# Altium schematic symbol library LimeMicroAltiumLib.SchLib: 590 symbols (part 5 of 13) (continued)
## BAT54C_shottky_diode
designator D?, comment BAT54C
Part Description: Diode Array 1 Pair Common Cathode Schottky 30 V 200mA (DC) Surface Mount TO-236-3, SC-59, SOT-23-3; Manufacturer: Comchip; Manufacturer Part Number 1: BAT54C-G; Max Reverse Voltage (DC): 30V; Max Power Dissipation: 225mW; Average Rectified Current: 200mA; Recovery Time: 5ns; Element Configuration: Common Cathode; ComponentLink1URL: http://www.farnell.com/datasheets/1918741.pdf; ComponentLink1Description: http://www.farnell.com/datasheets/1918741.pdf; ComponentLink2URL: http://www.farnell.com/datasheets/2353871.pdf; ComponentLink2Description: http://www.farnell.com/datasheets/2353871.pdf; ComponentLink3URL: https://www.alliedelec.com/m/d/272158a697e3f24d20806a718aa29d59.pdf; ComponentLink3Description: https://www.alliedelec.com/m/d/272158a697e3f24d20806a718aa29d59.pdf; ComponentLink4URL: http://www.onsemi.com/pub/Collateral/BAT54SLT1-D.PDF; ComponentLink4Description: http://www.onsemi.com/pub/Collateral/BAT54SLT1-D.PDF; Supplier 1: Digi-Key; Supplier Part Number 1: 641-1320-1-ND; Stock 1: 764277; Pricing 1: 1=0,23000, 10=0,18500, 100=0,09830, 500=0,06468, 1000=0,04399 (USD); RoHS: Yes; Mount: Surface Mount; Case/Package: TO-236-3; Package Quantity: 1; Reverse Recovery Time: 5ns; Packaging: Tape and Reel; ComponentLink5URL: https://datasheet.ciiva.com/4717/bat54-9536-4717410.pdf?src-supplier=Mouser; ComponentLink5Description: https://datasheet.ciiva.com/4717/bat54-9536-4717410.pdf?src-supplier=Mouser; ComponentLink6URL: https://datasheet.ciiva.com/904/bat54-904630.pdf?src-supplier=Digi-Key; ComponentLink6Description: https://datasheet.ciiva.com/904/bat54-904630.pdf?src-supplier=Digi-Key; ComponentLink7URL: https://datasheet.ciiva.com/904/bat54-904631.pdf?src-supplier=Digi-Key; ComponentLink7Description: https://datasheet.ciiva.com/904/bat54-904631.pdf?src-supplier=Digi-Key; ComponentLink8URL: https://datasheet.ciiva.com/904/bat54-904632.pdf?src-supplier=Digi-Key; ComponentLink8Description: https://datasheet.ciiva.com/904/bat54-904632.pdf?src-supplier=Digi-Key
footprint BAT54C_SOT23-3 (SOT23, 3 pin)
pins: A1, A2, C

## BAT54SLT1G_shottky_diode
designator D?, comment BAT54SLT1G
Manufacturer: ON Semiconductor; Part Description: Diode Array 1 Pair Series Connection Schottky 30V 200mA (DC) Surface Mount TO-236-3, SC-59, SOT-23-3; Max Surge Current: 600mA; Forward Current: 200mA; Forward Voltage: 800mV; Peak Reverse Current: 2uA; Recovery Time: 5ns; Element Configuration: Dual; Max Repetitive Reverse Voltage (Vrrm): 30V; Peak Non-Repetitive Surge Current: 1A; Power Dissipation: 225mW; Capacitance: 10pF; Supplier 1: Digi-Key; Manufacturer Part Number 1: BAT54SLT1G; RoHS: Yes; Stock 1: 1449452; Pricing 1: 1 = 0,19000, 10 = 0,17200, 100 = 0,09350, 500 = 0,05756, 1000 = 0,03925 (USD); Case/Package: SOT-23-3; Number of Pins: 3; Contact Plating: Matte,Tin; Min Operating Temperature: -55°C; Max Operating Temperature: 150°C; Packaging: Tape and Reel; Package Quantity: 3000; Average Rectified Current: 200mA; Reverse Recovery Time: 5ns; Max Reverse Leakage Current: 2uA; Current Rating: 200mA; Voltage Rating (DC): 30V; Max Reverse Voltage (DC): 30V; Max Forward Surge Current (Ifsm): 600mA; Length: 2.9mm; Height: 0.94mm; Width: 1.3mm; Radiation Hardening: No; Lead Free: Lead Free; Halogen Free: Halogen Free; REACH SVHC: No SVHC; ComponentLink1URL: http://www.farnell.com/datasheets/1918741.pdf; ComponentLink1Description: http://www.farnell.com/datasheets/1918741.pdf; ComponentLink2URL: http://www.farnell.com/datasheets/2353871.pdf; ComponentLink2Description: http://www.farnell.com/datasheets/2353871.pdf; ComponentLink3URL: https://www.alliedelec.com/m/d/272158a697e3f24d20806a718aa29d59.pdf; ComponentLink3Description: https://www.alliedelec.com/m/d/272158a697e3f24d20806a718aa29d59.pdf; ComponentLink4URL: http://www.onsemi.com/pub/Collateral/BAT54SLT1-D.PDF; ComponentLink4Description: http://www.onsemi.com/pub/Collateral/BAT54SLT1-D.PDF; Supplier Part Number 1: BAT54SLT1GOSCT-ND
footprint BAT54SLT1G_SOT23-3 (SOT23, 3 pin)
pins: A, A/C, C

## BAV99WT1G_DUAL_DIODE
designator VD?, comment BAV99WT1G
Manufacturer: ON Semiconductor; Manufacturer Part Number 1: SBAV99WT1G; Part Description: Diode Array 1 Pair Series Connection Standard 100V 215mA (DC) Surface Mount SC-70, SOT-323; Max Surge Current: 500mA; Recovery Time: 6ns; Forward Current: 715mA; Peak Reverse Current: 2.5uA; Forward Voltage: 1.25V; Element Configuration: Dual; Max Repetitive Reverse Voltage (Vrrm): 70V; Peak Non-Repetitive Surge Current: 2A; Max Reverse Voltage (DC): 100V; Max Power Dissipation: 200mW; Supplier 1: Digi-Key; Stock 1: 1217; Pricing 1: 1=0.32, 10=0.259, 100=0.1375, 500=0.09044, 1000=0.0615 (USD); Case/Package: SOT-323-3; Number of Pins: 3; Min Operating Temperature: -65°C; Max Operating Temperature: 150°C; Package Quantity: 3000; Packaging: Tape and Reel; Average Rectified Current: 715mA; Reverse Recovery Time: 6ns; Max Reverse Leakage Current: 2.5uA; Max Forward Surge Current (Ifsm): 500mA; Length: 2.2mm; Height: 0.9mm; Width: 1.35mm; Radiation Hardening: No; REACH SVHC: No SVHC; Lead Free: Lead Free; Halogen Free: Halogen Free; Supplier Part Number 1: SBAV99WT1GOSCT-ND
footprint SC-70_BAV99WT1G (SC-70 (SOT323), 3 pin)
pins: 1, 2, 3

## BF1105R,215
designator VT?, comment RF MOSFET
Manufacturer Part Number 1: BF1105R,215; Manufacturer: NXP Semiconductors; Part Description: RF MOSFET Transistors Trans MOSFET N-CH 7V 0.03A 4pin(3+Tab); Voltage - Rated: 7V; Noise Figure: 1.7dB; Current Rating: 30mA; Gain: 20dB; Transistor Type: N-Channel Dual Gate; Frequency: 800MHz; Voltage - Test: 5V; Supplier 1: Digi-Key; RoHS: RoHS Compliant; Supplier Device Package: SOT-143R; Power - Output: -; Current - Test: -; Packaging: Digi-Reel®; Package / Case: SOT-143R; Category: Discrete Semiconductor Products; Supplier Part Number 1: 568-12530-6-ND
footprint BF1105R_SOT143R4 (RF MOSFET Transistors Trans MOSFET N-CH 7V 0.03A 4pin(3+Tab). SOT-143R-4 package)
pins: 1 S, 2 D, 3 G2, 4 G1

## BFCN-1860+
designator IC?
Manufacturer: Minicircuits; Part Description: 1580 to 2200 MHz 50R bandpass filter; Supplier 1: Minicircuits; Supplier Part Number 1: BFCN-1860+; Manufacturer Part Number 1: BFCN-1860+
footprint SAW_BFCN-1860+
pins: 1 Input (in), 2 GND, 3 Output (out), 4 GND

## BFCN-2435+
designator IC?
Manufacturer: Minicircuits; Part Description: 2340 to 2530 MHz 50R bandpass filter; Supplier 1: Minicircuits; Supplier Part Number 1: BFCN-2435+; Manufacturer Part Number 1: BFCN-2435+
footprint SAW_BFCN-1860+
pins: 1 Input (in), 2 GND, 3 Output (out), 4 GND

## BFCN-2700+
designator IC?
Manufacturer: Minicircuits; Part Description: 2600 to 2800 MHz 50R bandpass filter; Supplier 1: Minicircuits; Supplier Part Number 1: BFCN-2700+; Manufacturer Part Number 1: BFCN-2700+
footprint SAW_BFCN-1860+
pins: 1 Input (in), 2 GND, 3 Output (out), 4 GND

## BFCN-2850+
designator IC?
Manufacturer: Minicircuits; Part Description: 2750 to 2950 MHz 50R bandpass filter; Supplier 1: Minicircuits; Supplier Part Number 1: BFCN-2850+; Manufacturer Part Number 1: BFCN-2850+
footprint SAW_BFCN-1860+
pins: 1 Input (in), 2 GND, 3 Output (out), 4 GND

## BFCV-3350+
designator IC?
LTCC Bandpass Filter: 50Ω, 2570 to 4130 MHz; Manufacturer: Mini-Circuits; Part Description: LTCC Bandpass Filter: 50Ω, 2570 to 4130 MHz; Manufacturer Part Number 1: BFCV-3350+; Supplier 1: Mini-Circuits; Supplier Part Number 1: BFCV-3350+
footprint BFCV-3350+
pins: 1 IN (in), 2 GND, 3 OUT (out), 4 GND

## BFT92,215_PNP
designator VT, comment BFT92,215
Manufacturer: NXP Semiconductors; Part Description: RF TRANS PNP 15V 5GHZ TO236AB; Manufacturer Part Number: BFT92215; Polarity: PNP; Max Power Dissipation: 300mW; hFE Min: 50; Number of Elements: 1; Emitter Base Voltage (VEBO): 2V; Max Collector Current: 25mA; Frequency: 5GHz; Collector Emitter Voltage (VCEO): 15V; Collector Base Voltage (VCBO): 20V; Gain: 18dB; Element Configuration: Single; Continuous Collector Current: -25mA; Supplier 1: Digi-Key; Stock 1: 0; RoHS: Yes; Mount: Surface Mount; Case/Package: TO-236AB; Number of Pins: 3; Weight: 0.00709oz; Contact Plating: Tin; Min Operating Temperature: -65°C; Max Operating Temperature: 175°C; Packaging: Tape and Reel; Package Quantity: 1; Output Power: 300mW; Transition Frequency: 5GHz; Collector Emitter Breakdown Voltage: 15V; Max Breakdown Voltage: 15V; Power Dissipation: 300mW; Max Frequency: 5GHz; Gain Bandwidth Product: 5GHz; Series: -; Length: 3mm; Width: 1.4mm; Height: 1mm; Radiation Hardening: No; Lead Free: Lead Free; REACH SVHC: No SVHC; ComponentLink1URL: https://datasheet.ciiva.com/29696/1323776-29696333.pdf?src-supplier=Jameco; ComponentLink1Description: https://datasheet.ciiva.com/29696/1323776-29696333.pdf?src-supplier=Jameco; ComponentLink2URL: https://datasheet.ciiva.com/965/bft92-cnv-965053.pdf?src-supplier=Digi-Key; ComponentLink2Description: https://datasheet.ciiva.com/965/bft92-cnv-965053.pdf?src-supplier=Digi-Key; ComponentLink3URL: https://datasheet.ciiva.com/6362/bft92-cnv-6362733.pdf?src-supplier=Digi-Key; ComponentLink3Description: https://datasheet.ciiva.com/6362/bft92-cnv-6362733.pdf?src-supplier=Digi-Key; ComponentLink4URL: https://datasheet.ciiva.com/965/bft92-cnv-965054.pdf?src-supplier=Digi-Key; ComponentLink4Description: https://datasheet.ciiva.com/965/bft92-cnv-965054.pdf?src-supplier=Digi-Key; ComponentLink5URL: https://datasheet.ciiva.com/16221/bft92-cnv-16221865.pdf?src-supplier=Future+Electronics; ComponentLink5Description: https://datasheet.ciiva.com/16221/bft92-cnv-16221865.pdf?src-supplier=Future+Electronics; ComponentLink6URL: https://datasheet.ciiva.com/11198/bft92-cnv-11198214.pdf?src-supplier=Avnet; ComponentLink6Description: https://datasheet.ciiva.com/11198/bft92-cnv-11198214.pdf?src-supplier=Avnet; ComponentLink7URL: https://datasheet.ciiva.com/11204/bft92-cnv-11204747.pdf?src-supplier=Avnet; ComponentLink7Description: https://datasheet.ciiva.com/11204/bft92-cnv-11204747.pdf?src-supplier=Avnet; ComponentLink8URL: https://datasheet.ciiva.com/11204/bft92-cnv-11204828.pdf?src-supplier=Avnet; ComponentLink8Description: https://datasheet.ciiva.com/11204/bft92-cnv-11204828.pdf?src-supplier=Avnet; Supplier Part Number 1: 568-1655-1-ND
footprint BFT92,215_PNP_STO23-3
pins: 1 S, 2 E, 3 C

## BG13D
designator BG13D, comment IC?
Part Description: 5-6000 MHz cascadable InGaP HBT gain block; Manufacturer Part Number 1: BG13D; Supplier Part Number: BG13D; Supplier 1: Berex
pins: 1 IN (in), 2 GND, 3 OUT (out)

## BL2012-05V2400ABRK
designator T?
Part Description: RF balun; 900MHz-3.8GHz; 50R, 1:1, 2012 package; Manufacturer 1: Advanced Ceramic X (ACX); Supplier 1: Advanced Ceramic X (ACX); Manufacturer Part Number 1: BL2012-05V2400ABRK; Supplier Part Number 1: BL2012-05V2400ABRK
footprint BL2012-05V2400ABRK
pins: 1 UNBAL (io), 2 GND, 3 BAL1 (io), 4 BAL2 (io), 5 GND, 6 NC

## BL2012-07M1975RK
designator T?
Part Description: RF balun; 950MHz-3.5GHz; 50R (original impedance 75R), 1:1, 2012 package; Manufacturer 1: Advanced Ceramic X (ACX); Supplier 1: Advanced Ceramic X (ACX); Manufacturer Part Number 1: BL2012-07M1975RK; Supplier Part Number 1: BL2012-07M1975RK
footprint BL2012-07M1975RK
pins: 1 GND/UNBAL (io), 2 UNBAL/GND (io), 3 GND, 4 BAL (io), 5 NC, 6 BAL (io)

## BLB0x
designator IC?, comment BLB01/BLB02
Part Description: 1.5-2.7 GHz High Linearity LNA; Manufacturer Part Number 1: BLB02; Supplier Part Number: BLB02; Supplier 1: Berex
footprint BLB0x_LNA (BLB01 and BLB02 footprint)
pins: 1 Ven/Vbias (in), 2 RFin (in), 3 NC, 4 NC, 5 NC, 6 NC, 7 RFout/Vdd (out), 8 NC, 9 PAD

## BLB02
designator BLB02, comment IC?
Part Description: 1.5-2.7 GHz High Linearity LNA; Manufacturer Part Number 1: BLB02; Supplier Part Number: BLB02; Supplier 1: Berex
pins: 1 Ven/Vbias (in), 2 RFin (in), 3 NC, 4 NC, 5 NC, 6 NC, 7 RFout/Vdd (out), 8 NC, 9 PAD

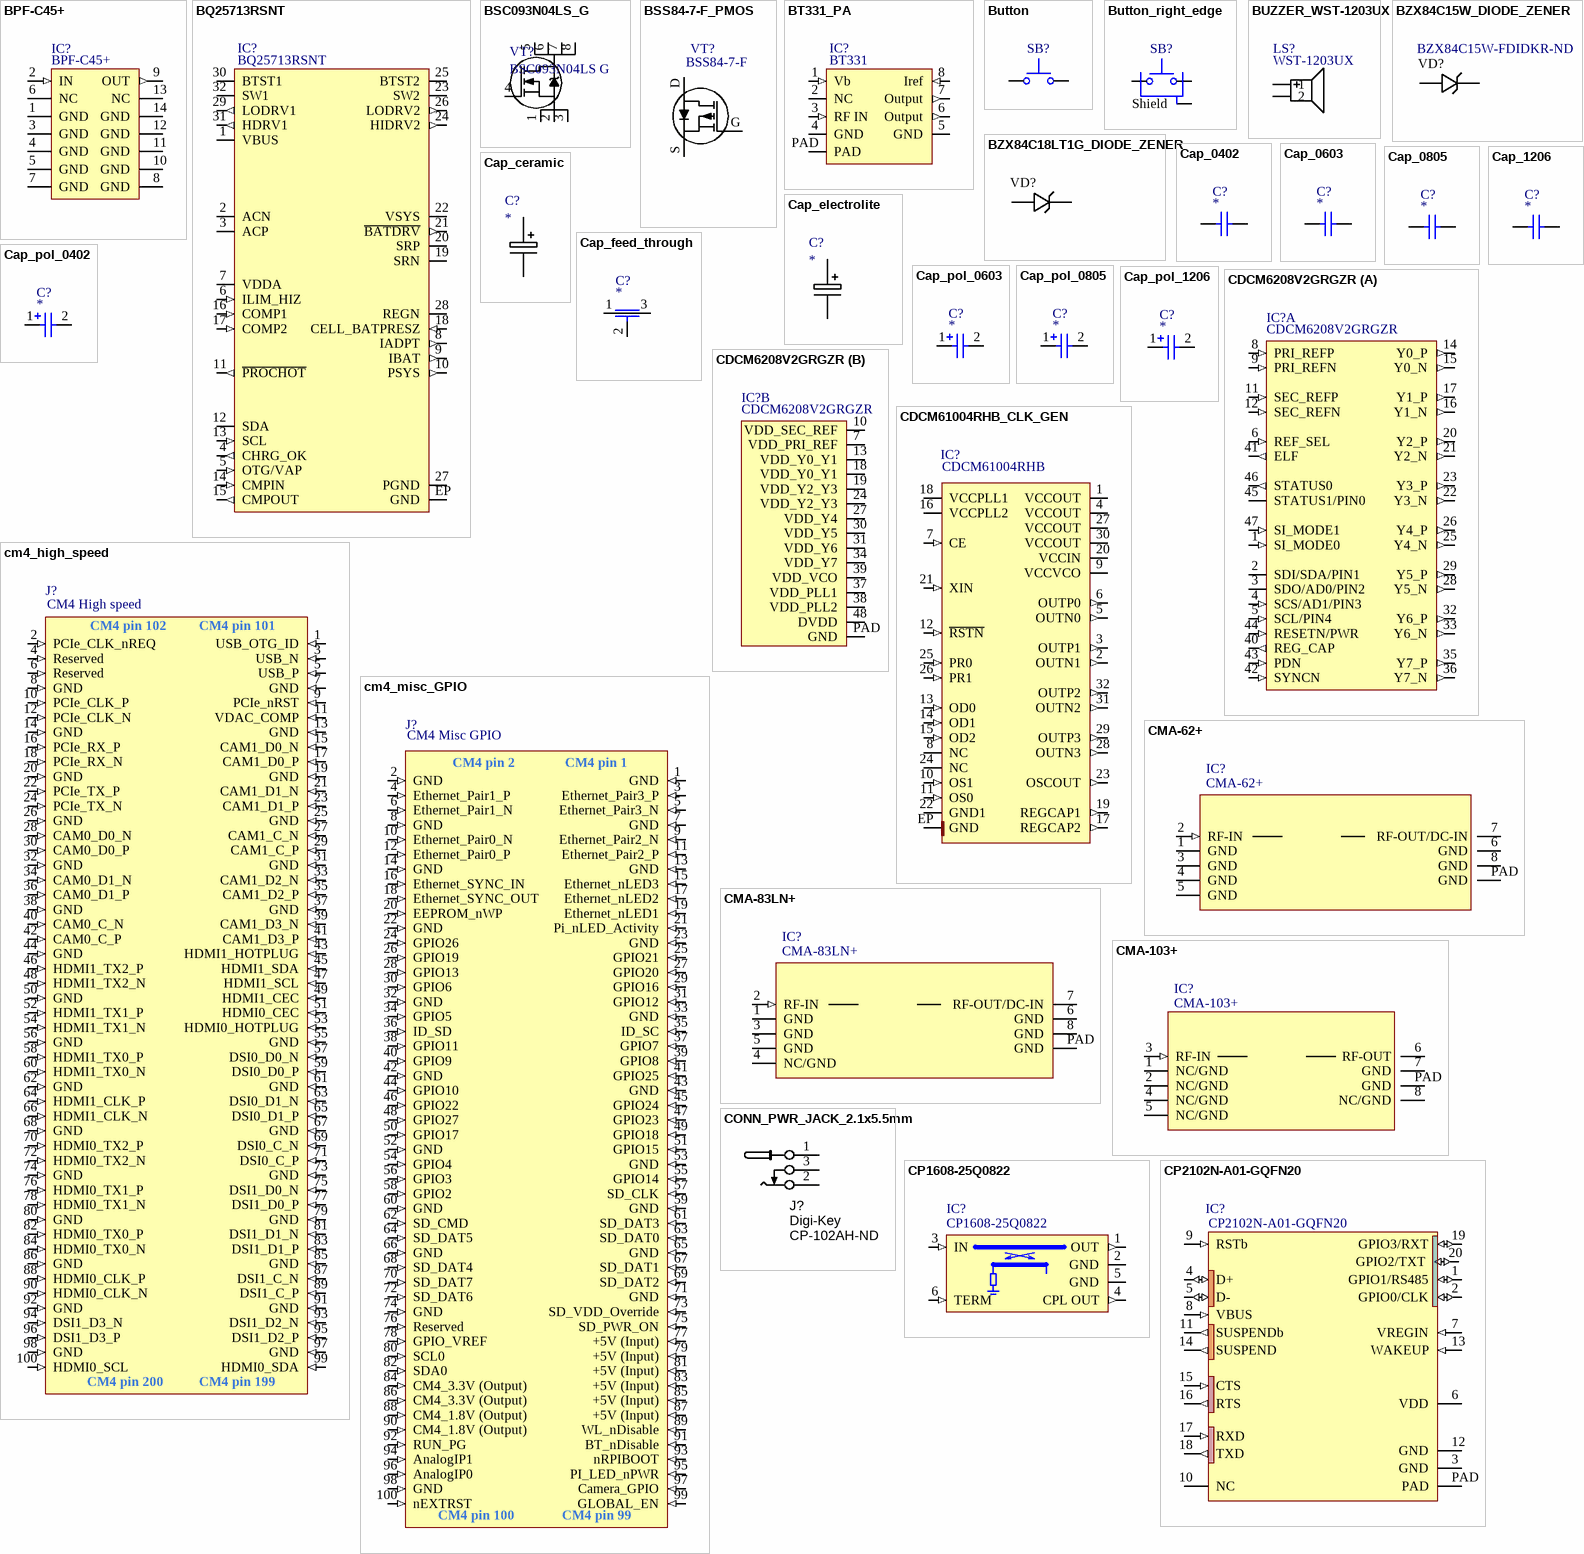
[diagram p24: symbols BPF-C45+ to CP2102N-A01-GQFN20]

## BPF-C45+
designator IC?
Part Description: Bandpass Filter; 50Ω; 30 to 70 MHz; CASE STYLE: HU1186; Manufacturer: MiniCircuits; Supplier 1: MiniCircuits; Manufacturer Part Number 1: BPF-C45+; Supplier Part Number 1: BPF-C45+
footprint BPF-C45+
pins: 1 GND, 2 IN (in), 3 GND, 4 GND, 5 GND, 6 NC, 7 GND, 8 GND, 9 OUT (out), 10 GND, 11 GND, 12 GND, 13 NC, 14 GND

## BQ25713RSNT
designator IC?
Manufacturer: Texas Instruments; Part Description: Battery Battery Monitor IC Multi-Chemistry 32-WQFN (4x4); Fault Protection: Over Current,Over Voltage,Over Temperature; Interface: I2C; Number of Cells: 1234; Supplier 1: Digi-Key; Supplier Part Number 1: 296-50241-1-ND; Manufacturer Part Number 1: BQ25713RSNT; Stock 1: 275; Pricing 1: 1=4,27000, 10=3,83200, 25=3,62240, 100=2,97850 (USD); RoHS: No; Min Operating Temperature: -40°C; Max Operating Temperature: 85°C; Packaging: Tape and Reel; ComponentLink1URL: http://www.ti.com/lit/ds/symlink/bq25713.pdf?src-supplier=Digi-Key; ComponentLink1Description: http://www.ti.com/lit/ds/symlink/bq25713.pdf?src-supplier=Digi-Key
footprint BQ25713RSNT_QFN4X4_32 (QFN, 32-Leads, Body 4.15x4.15mm, Pitch 0.4mm, IPC High Density)
pins: 1 VBUS, 2 ACN, 3 ACP, 4 CHRG_OK (out), 5 OTG/VAP (in), 6 ILIM_HIZ (in), 7 VDDA, 8 IADPT (out), 9 IBAT (out), 10 PSYS (out), 11 ~{PROCHOT} (out), 12 SDA (io), 13 SCL (in), 14 CMPIN (in), 15 CMPOUT (out), 16 COMP1 (in), 17 COMP2 (in), 18 CELL_BATPRESZ (in), 19 SRN, 20 SRP, 21 ~{BATDRV} (out), 22 VSYS, 23 SW2, 24 HIDRV2 (out), 25 BTST2, 26 LODRV2 (out), 27 PGND, 28 REGN, 29 LODRV1 (out), 30 BTST1, 31 HDRV1 (out), 32 SW1, EP GND

## BSC093N04LS_G
designator VT?, comment BSC093N04LS G
Manufacturer: Infineon Technologies; Power - Max: 35W; Vgs(th) (Max) @ Id: 2V @ 14µA; Current - Continuous Drain (Id) @ 25°C: 13A (Ta), 49A (Tc); FET Type: MOSFET N-Channel, Metal Oxide; Rds On (Max) @ Id, Vgs: 9.3 mOhm @ 40A, 10V; Gate Charge (Qg) @ Vgs: 24nC @ 10V; Input Capacitance (Ciss) @ Vds: 1900pF @ 20V; Drain to Source Voltage (Vdss): 40V; Supplier 1: Digi-Key; Category: Discrete Semiconductor Products; Manufacturer Part Number: BSC093N04LS G; Package / Case: 8-PowerTDFN; Supplier Part Number 1: BSC093N04LS GDKR-ND
footprint BSC093N04LS_G (SON, 8-Leads, Body 5,32x6,15mm, Pitch 1,27mm, Thermal Pad 3,60x4,05mm, IPC Medium Density)
pins: 1 S, 2 S, 3 S, 4 G, 5 D, 6 D, 7 D, 8 D

## BSS84-7-F_PMOS
designator VT?, comment BSS84-7-F
Part Description: MOSFET P-CH 50V 130MA SOT23-3; Manufacturer: Diodes; Input Capacitance: 45pF; Number of Elements: 1; Max Power Dissipation: 300mW; Rds On Max: 10R; Voltage Rating (DC): -50V; Current Rating: -130mA; Element Configuration: Single; Gate to Source Voltage (Vgs): 20V; Turn-Off Delay Time: 18ns; Continuous Drain Current (ID): 130mA; Turn-On Delay Time: 10ns; Threshold Voltage: -800mV; ComponentLink1URL: https://datasheet.ciiva.com/30021/csd25402q3a-30021955.pdf?src-supplier=Avnet; ComponentLink1Description: https://datasheet.ciiva.com/30021/csd25402q3a-30021955.pdf?src-supplier=Avnet; Supplier 1: Digi-Key; Supplier Part Number 1: BSS84-FDICT-ND; Manufacturer Part Number 1: BSS84-7-F; Stock 1: 952761; Pricing 1: 1=0,23000, 10=0,19000, 25=0,15920, 100=0,07780, 500=0,06488, 1000=0,04508 (USD); RoHS: Yes; Mount: Surface Mount; Case/Package: SOT-23; Number of Pins: 3; Contact Plating: Tin,Matte; Weight: 0.000282oz; Min Operating Temperature: -55°C; Max Operating Temperature: 150°C; Packaging: Tape and Reel; Package Quantity: 3000; Number of Channels: 1; On-State Resistance: 10R; Power Dissipation: 300mW; Drain to Source Resistance: 10R; Drain to Source Voltage (Vdss): -50V; Length: 2.9mm; Width: 1.3mm; Height: 1mm; Lead Free: Lead Free; REACH SVHC: No SVHC; ComponentLink2URL: https://datasheet.ciiva.com/16221/ds30149-16221984.pdf?src-supplier=Future+Electronics; ComponentLink2Description: https://datasheet.ciiva.com/16221/ds30149-16221984.pdf?src-supplier=Future+Electronics; ComponentLink3URL: https://datasheet.ciiva.com/4442/ds30149-42275-4442950.pdf?src-supplier=Mouser; ComponentLink3Description: https://datasheet.ciiva.com/4442/ds30149-42275-4442950.pdf?src-supplier=Mouser; ComponentLink4URL: https://datasheet.ciiva.com/934/ds30149-934539.pdf?src-supplier=Digi-Key; ComponentLink4Description: https://datasheet.ciiva.com/934/ds30149-934539.pdf?src-supplier=Digi-Key; ComponentLink5URL: https://datasheet.ciiva.com/8115/ds30149-8115403.pdf?src-supplier=Avnet; ComponentLink5Description: https://datasheet.ciiva.com/8115/ds30149-8115403.pdf?src-supplier=Avnet; ComponentLink6URL: https://datasheet.ciiva.com/934/ds30149-934540.pdf?src-supplier=Digi-Key; ComponentLink6Description: https://datasheet.ciiva.com/934/ds30149-934540.pdf?src-supplier=Digi-Key; ComponentLink7URL: https://datasheet.ciiva.com/49020/70437757-49020999.pdf?src-supplier=Allied+Electronics; ComponentLink7Description: https://datasheet.ciiva.com/49020/70437757-49020999.pdf?src-supplier=Allied+Electronics
footprint SOT23-3 (Footprint not found)
pins: D, G, S

## BT331_PA
designator IC?, comment BT331
Berex BT331 RF PA; Part Description: 700-2700 MHz 1.5-2W RF Power Amplifier; Manufacturer Part Number 1: BT331; Supplier Part Number 1: BT331; Supplier 1: Berex; Manufacturer: Berex
footprint BT331_PA (Berex BT331 RF PA)
pins: 1 Vb (in), 2 NC, 3 RF IN (in), 4 GND, 5 GND, 6 Output (out), 7 Output (out), 8 Iref (in), PAD

## Button
designator SB?  (value not drawn)
pins: 1, 2

## Button_right_edge
designator SB?, comment Switch tactile right edge  (value not drawn)
Part Description: Tactile Switch SPST-NO Side Actuated Through Hole, Right Angle
footprint SW_TACTILE_RIGHT_EDGE (part number 1825027-5)
pins: 1, 2, Shield

## BUZZER_WST-1203UX
designator LS?, comment WST-1203UX
Manufacturer: Soberton Inc.; Part Description: Buzzers Indicator, Internally Driven Magnetic 3V 30mA 2.3kHz 82dB @ 3V, 10cm Through Hole PC Pins; Driver Circuitry: Indicator, Internally Driven; Input Type: Zero-Peak Signal; Voltage Range: 2 ~ 4V; Frequency: 2.3kHz; Operating Mode: Single Tone; Sound Pressure Level (SPL): 82dB @ 3V, 10cm; Current - Supply: 30mA; Port Location: Top; Ratings: Washable; Supplier 1: Digi-Key; Manufacturer Part Number 1: WST-1203UX; RoHS: RoHS Compliant; Category: Audio Products; Stock 1: 22696; Pricing 1: 1=1.41, 10=1.117, 25=1.0176, 50=0.9516, 100=0.8855, 250=0.80852, 500=0.7535, 1000=0.704, 5000=0.6875 (USD); Packaging: Tray; Part Status: Active; Technology: Magnetic; Duration: -; Operating Temperature: -20°C ~ 60°C; Approvals: -; Mounting Type: Through Hole; Termination: PC Pins; Size / Dimension: 0.472" Dia (12.00mm); Height - Seated (Max): 0.303" (7.70mm); ComponentLink1URL: http://cirlw3yrzg4afc1x47lv2k18.wpengine.netdna-cdn.com/wp-content/uploads/2016/12/WST-1203UX-new.pdf; ComponentLink1Description: http://cirlw3yrzg4afc1x47lv2k18.wpengine.netdna-cdn.com/wp-content/uploads/2016/12/WST-1203UX-new.pdf; Supplier Part Number 1: 433-1047-ND
footprint BUZZER_WST-1203UX
pins: 1, 2

## BZX84C15W_DIODE_ZENER
designator VD?  Supplier Part Number 1: BZX84C15W-FDIDKR-ND
Part Description: Zener Diode 15V 200mW ±6% Surface Mount SOT-323; Manufacturer: Diodes; Manufacturer Part Number 1: BZX84C15W-7-F; Max Power Dissipation: 200mW; Tolerance: 6%; Zener Voltage: 15V; Impedance: 30R; Max Reverse Leakage Current: 100nA; Zener Current: 5mA; Element Configuration: Single; Output Current: 23mA; ESD Protection: No; ComponentLink1URL: http://www.onsemi.com/pub/Collateral/BZX84C2V4LT1-D.PDF; ComponentLink1Description: http://www.onsemi.com/pub/Collateral/BZX84C2V4LT1-D.PDF; ComponentLink2URL: https://www.verical.com/server-webapp/html/getDatasheet?partID=101861; ComponentLink2Description: https://www.verical.com/server-webapp/html/getDatasheet?partID=101861; ComponentLink3URL: http://www.farnell.com/datasheets/1874542.pdf; ComponentLink3Description: http://www.farnell.com/datasheets/1874542.pdf; ComponentLink4URL: https://www.alliedelec.com/m/d/89a0f5fa5faf07909887b6182710b562.pdf; ComponentLink4Description: https://www.alliedelec.com/m/d/89a0f5fa5faf07909887b6182710b562.pdf; ComponentLink5URL: https://www.onsemi.com/pub/Collateral/BZX84C2V4LT1-D.PDF; ComponentLink5Description: https://www.onsemi.com/pub/Collateral/BZX84C2V4LT1-D.PDF; ComponentLink6URL: http://www.onsemi.com/pub_link/Collateral/BZX84C2V4LT1-D.PDF; ComponentLink6Description: http://www.onsemi.com/pub_link/Collateral/BZX84C2V4LT1-D.PDF; Supplier 1: Digi-Key; Stock 1: 4066; Pricing 1: 1=0.38, 10=0.284, 100=0.161, 500=0.1066, 1000=0.08173 (USD); Mount: Surface Mount; Case/Package: SOT-323; Number of Pins: 3; Weight: 0.000212oz; Contact Plating: Matte,Tin; Min Operating Temperature: -65°C; Max Operating Temperature: 125°C; Packaging: Tape and Reel; Package Quantity: 3000; Power Dissipation: 200mW; Voltage Tolerance: 6%; Test Current: 5mA; Termination: SMD/SMT; Peak Reverse Current: 100nA; Power Rating: 200mW; Voltage Rating (DC): 15V; Length: 2.2mm; Height: 1mm; Width: 1.35mm; Radiation Hardening: No; Lead Free: Lead Free; ComponentLink7URL: http://www.diodes.com/datasheets/ds30066.pdf; ComponentLink7Description: http://www.diodes.com/datasheets/ds30066.pdf; ComponentLink8URL: https://www.diodes.com/assets/Datasheets/ds30066.pdf; ComponentLink8Description: https://www.diodes.com/assets/Datasheets/ds30066.pdf; ComponentLink9URL: http://www.diodes.com//datasheets/ds30066.pdf; ComponentLink9Description: http://www.diodes.com//datasheets/ds30066.pdf
footprint SOT323 (SOT323, 3 pin)
pins: 1 A, 3 C

## BZX84C18LT1G_DIODE_ZENER
designator VD?
Diode Zener SMD SOD-323; Part Description: Zener Diode 18V 225mW ±6% Surface Mount SOT-23-3 (TO-236); Manufacturer: ON Semiconductor; Manufacturer Part Number: BZX84C18LT1G; Material: Plastic; Max Power Dissipation: 225mW; Tolerance: 6%; Max Reverse Leakage Current: 50nA; Impedance: 45R; Power Dissipation: 300mW; Zener Voltage: 18V; Test Current: 5mA; Element Configuration: Single; Breakdown Voltage: 19.1V; Forward Voltage: 900mV; Zener Current: 10mA; ESD Protection: Yes; Supplier 1: Digi-Key; Stock 1: 25889; Pricing 1: 1=0.15, 10=0.135, 100=0.0735, 500=0.04522, 1000=0.03084 (USD); Case/Package: SOT-23-3; Number of Pins: 3; Contact Plating: Matte,Tin; Min Operating Temperature: -65°C; Max Operating Temperature: 150°C; Packaging: Tape and Reel; Package Quantity: 3000; Voltage Tolerance: 6%; Voltage Rating (DC): 18V; Power Rating: 225mW; Working Voltage: 18V; Peak Reverse Current: 50nA; Length: 2.9mm; Height: 0.94mm; Width: 1.3mm; Radiation Hardening: No; Lead Free: Lead Free; Halogen Free: Halogen Free; REACH SVHC: No SVHC; ComponentLink1URL: http://www.onsemi.com/pub/Collateral/BZX84C2V4LT1-D.PDF; ComponentLink1Description: http://www.onsemi.com/pub/Collateral/BZX84C2V4LT1-D.PDF; ComponentLink2URL: https://www.verical.com/server-webapp/html/getDatasheet?partID=101861; ComponentLink2Description: https://www.verical.com/server-webapp/html/getDatasheet?partID=101861; ComponentLink3URL: http://www.farnell.com/datasheets/1874542.pdf; ComponentLink3Description: http://www.farnell.com/datasheets/1874542.pdf; ComponentLink4URL: https://www.alliedelec.com/m/d/89a0f5fa5faf07909887b6182710b562.pdf; ComponentLink4Description: https://www.alliedelec.com/m/d/89a0f5fa5faf07909887b6182710b562.pdf; ComponentLink5URL: https://www.onsemi.com/pub/Collateral/BZX84C2V4LT1-D.PDF; ComponentLink5Description: https://www.onsemi.com/pub/Collateral/BZX84C2V4LT1-D.PDF; ComponentLink6URL: http://www.onsemi.com/pub_link/Collateral/BZX84C2V4LT1-D.PDF; ComponentLink6Description: http://www.onsemi.com/pub_link/Collateral/BZX84C2V4LT1-D.PDF; Supplier Part Number 1: BZX84C18LT1GOSCT-ND
footprint SOT23-3_v2 (SOT23, 3 pin)
pins: 1 A, 3 C

## Cap_0402
designator C?
Value: *
footprint CAP0402 (Chip Capacitor, Body 1.0x0.5mm, 0402, IPC Medium Density)
pins: 1, 2

## Cap_0603
designator C?
Value: *
footprint CAP0603 (Chip Capacitor, Body 1.6x0.8mm, 0603, IPC Medium Density)
pins: 1, 2

## Cap_0805
designator C?
Value: *
footprint CAP0805 (Chip Capacitor, Body 2.0x1.2mm, 0805, IPC Medium Density)
pins: 1, 2

## Cap_1206
designator C?
Value: *
footprint CAP1206 (Chip Capacitor, Body 3.2x1.6mm, 1206, IPC Medium Density)
pins: 1, 2

## Cap_ceramic
designator C?
Value: *
footprint Cap_pol_100uF
pins: 1, 2

## Cap_electrolite
designator C?
Value: *
footprint Cap_pol_100uF
pins: 1, 2

## Cap_feed_through
designator C?
Value: *
pins: 1, 2, 3

## Cap_pol_0402
designator C?
Value: *
pins: 1, 2

## Cap_pol_0603
designator C?
Value: *
pins: 1, 2

## Cap_pol_0805
designator C?
Value: *
pins: 1, 2

## Cap_pol_1206
designator C?
Value: *
pins: 1, 2

## CDCM6208V2GRGZR
designator IC?
Manufacturer: Texas Instruments; Part Description: IC CLK GEN 2:8 LOW JITTER 48VQFN; Number of Circuits: 1; Max Frequency: 800MHz; Input: Crystal; Number of Outputs: 8; Supplier 1: Digi-Key; Manufacturer Part Number 1: CDCM6208V2GRGZR; Stock 1: 1501; Pricing 1: 1 = 11,22000, 10 = 10,13400, 100 = 8,38960, 500 = 7,30558, 1000 = 6,36293 (USD); RoHS: Yes; Mount: Surface Mount; Case/Package: VQFN; Min Operating Temperature: -40°C; Max Operating Temperature: 85°C; Packaging: Tape and Reel; Lead Free: Lead Free; ComponentLink1URL: http://www.ti.com/lit/ds/symlink/cdcm6208v2g.pdf?src-supplier=Digi-Key; ComponentLink1Description: http://www.ti.com/lit/ds/symlink/cdcm6208v2g.pdf?src-supplier=Digi-Key; ComponentLink2URL: http://www.ti.com/lit/gpn/cdcm6208v2g?src-supplier=Mouser; ComponentLink2Description: http://www.ti.com/lit/gpn/cdcm6208v2g?src-supplier=Mouser; Supplier Part Number 1: 296-51011-1-ND
part A pins: 1 SI_MODE0 (in), 2 SDI/SDA/PIN1 (io), 3 SDO/AD0/PIN2 (io), 4 SCS/AD1/PIN3 (in), 5 SCL/PIN4 (in), 6 REF_SEL (in), 8 PRI_REFP (in), 9 PRI_REFN (in), 11 SEC_REFP (in), 12 SEC_REFN (in), 14 Y0_P (out), 15 Y0_N (out), 16 Y1_N (out), 17 Y1_P (out), 20 Y2_P (out), 21 Y2_N (out), 22 Y3_N (out), 23 Y3_P (out), 25 Y4_N (out), 26 Y4_P (out), 28 Y5_N (out), 29 Y5_P (out), 32 Y6_P (out), 33 Y6_N (out), 35 Y7_P (out), 36 Y7_N (out), 40 REG_CAP (out), 41 ELF (out), 42 SYNCN (in), 43 PDN (in), 44 RESETN/PWR (in), 45 STATUS1/PIN0 (io), 46 STATUS0 (out), 47 SI_MODE1 (in)
part B pins: 7 VDD_PRI_REF (power), 10 VDD_SEC_REF (power), 13 VDD_Y0_Y1 (power), 18 VDD_Y0_Y1 (power), 19 VDD_Y2_Y3 (power), 24 VDD_Y2_Y3 (power), 27 VDD_Y4 (power), 30 VDD_Y5 (power), 31 VDD_Y6 (power), 34 VDD_Y7 (power), 37 VDD_PLL1 (power), 38 VDD_PLL2 (power), 39 VDD_VCO (power), 48 DVDD (power), PAD GND

## CDCM61004RHB_CLK_GEN
designator IC?, comment CDCM61004RHB
Part Description: Clock Generator IC 683.27MHz 32-VFQFN Exposed Pad; Manufacturer: Texas Instruments; Manufacturer Part Number 1: CDCM61004RHBT; Frequency: 683.28MHz; Number of Outputs: 4; Nominal Supply Current: 215mA; Number of Elements: 1; Min Supply Voltage: 3V; Max Supply Voltage: 3.6V; Operating Supply Voltage: 3.3V; Max Frequency: 683.27MHz; Operating Supply Current: 108mA; Max Supply Current: 65mA; Input: Crystal; Input Current: 200mA; Supplier 1: Digi-Key; Supplier Part Number 1: 296-24194-1-ND; Stock 1: 1415; Pricing 1: 1=9,06000, 10=8,18800, 25=7,80760, 100=6,77930 (USD); RoHS: Yes; Mount: Surface Mount; Case/Package: VQFN; Number of Pins: 32; Weight: 0.002547oz; Contact Plating: Gold; Min Operating Temperature: -40°C; Max Operating Temperature: 85°C; Packaging: Tape and Reel; Package Quantity: 1; Number of Circuits: 1; Termination: SMD/SMT; Length: 5mm; Width: 5mm; Height: 0.8mm; Radiation Hardening: No; REACH SVHC: No SVHC; Lead Free: Lead Free; RoHS Compliant: Yes; ComponentLink1URL: https://datasheet.ciiva.com/6677/cdcm61004-6677168.pdf?src-supplier=Digi-Key; ComponentLink1Description: https://datasheet.ciiva.com/6677/cdcm61004-6677168.pdf?src-supplier=Digi-Key; ComponentLink2URL: https://datasheet.ciiva.com/14247/cdcm61004-14247059.pdf?src-supplier=Avnet; ComponentLink2Description: https://datasheet.ciiva.com/14247/cdcm61004-14247059.pdf?src-supplier=Avnet; ComponentLink3URL: https://datasheet.ciiva.com/1138/1781794-1138868.pdf?src-supplier=Element14; ComponentLink3Description: https://datasheet.ciiva.com/1138/1781794-1138868.pdf?src-supplier=Element14; ComponentLink4URL: https://datasheet.ciiva.com/26033/cdcm61004-26033080.pdf?src-supplier=Avnet+Europe; ComponentLink4Description: https://datasheet.ciiva.com/26033/cdcm61004-26033080.pdf?src-supplier=Avnet+Europe; ComponentLink5URL: https://datasheet.ciiva.com/14247/cdcm61004-14247241.pdf?src-supplier=Avnet; ComponentLink5Description: https://datasheet.ciiva.com/14247/cdcm61004-14247241.pdf?src-supplier=Avnet; ComponentLink6URL: https://datasheet.ciiva.com/46396/1781794-46396315.pdf?src-supplier=Element14; ComponentLink6Description: https://datasheet.ciiva.com/46396/1781794-46396315.pdf?src-supplier=Element14; ComponentLink7URL: https://datasheet.ciiva.com/1141/cdcm61004-1141260.pdf?src-supplier=Farnell; ComponentLink7Description: https://datasheet.ciiva.com/1141/cdcm61004-1141260.pdf?src-supplier=Farnell; ComponentLink8URL: https://datasheet.ciiva.com/15153/getdatasheetpartid-226426-15153388.pdf?src-supplier=Verical; ComponentLink8Description: https://datasheet.ciiva.com/15153/getdatasheetpartid-226426-15153388.pdf?src-supplier=Verical; ComponentLink9URL: https://datasheet.ciiva.com/46433/1781794-46433420.pdf?src-supplier=Element14; ComponentLink9Description: https://datasheet.ciiva.com/46433/1781794-46433420.pdf?src-supplier=Element14; ComponentLink10URL: https://datasheet.ciiva.com/1200/cdcm61004-1200223.pdf?src-supplier=Digi-Key; ComponentLink10Description: https://datasheet.ciiva.com/1200/cdcm61004-1200223.pdf?src-supplier=Digi-Key
footprint CDCM61004RHB_CLK_GEN_VQFN32
pins: 1 VCCOUT (power), 2 OUTN1 (out), 3 OUTP1 (out), 4 VCCOUT (power), 5 OUTN0 (out), 6 OUTP0 (out), 7 CE (in), 8 NC, 9 VCCVCO (power), 10 OS1 (in), 11 OS0 (in), 12 ~{RSTN} (in), 13 OD0 (in), 14 OD1 (in), 15 OD2 (in), 16 VCCPLL2 (power), 17 REGCAP2 (out), 18 VCCPLL1 (power), 19 REGCAP1 (out), 20 VCCIN (power), 21 XIN (in), 22 GND1, 23 OSCOUT (out), 24 NC, 25 PR0 (in), 26 PR1 (in), 27 VCCOUT (power), 28 OUTN3 (out), 29 OUTP3 (out), 30 VCCOUT (power), 31 OUTN2 (out), 32 OUTP2 (out), EP GND